# Altium footprint library FootprintLib.PcbLib: 35 footprints (part 3 of 3)
Each footprint in its own frame and in the unit in brackets; x right, y up, seen from the top. Pads: shape width x height; smd on the part's side, far side on the other; paste and mask are expansions set on the pad; w line width, h text height; cw(c..) or ccw(c..) is an arc to the next point about the centre after c.
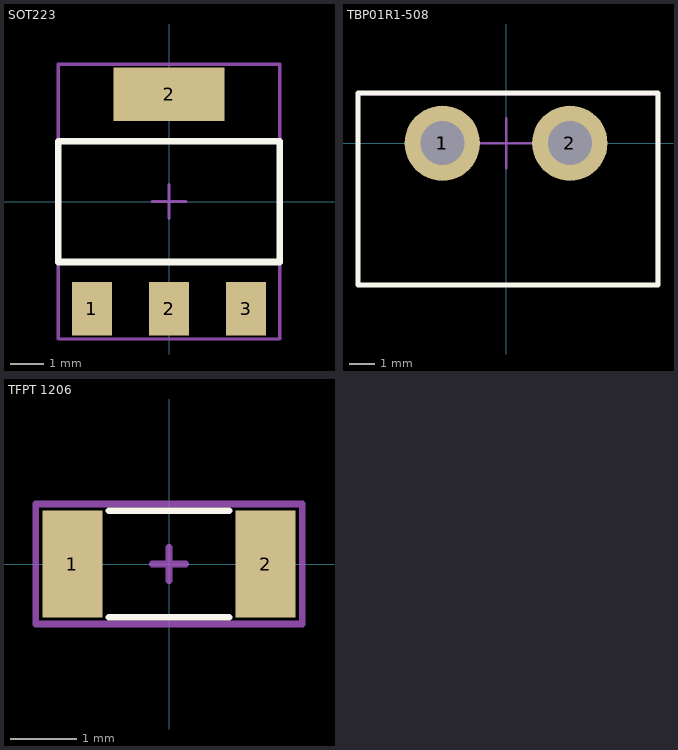
[diagram p2: the footprints below, top view; thin cyan lines are the x and y axes]

## SOT223 [mm]
pads (4):
  rect 1.2x1.6 smd mask+0.05: 1(-2.3,-3.2) 2(0,-3.2) 3(2.3,-3.2)
  rect 3.3x1.6 smd mask+0.05: 2(0,3.2)
Top Overlay:
  lines w0.2: -3.3,-1.8 -3.3,1.8 3.3,1.8 3.3,-1.8 -3.3,-1.8
Top Component Center:
  lines w0.1: -0.5,0 0.5,0 ; 0,-0.5 0,0.5 ; -3.3,-4.1 -3.3,4.1 3.3,4.1 3.3,-4.1 -3.3,-4.1
Top Designator:
  lines w0.1: -3.3,-4.1 -3.3,4.1 3.3,4.1 3.3,-4.1 -3.3,-4.1
  text ".Designator" at -2.1,-0.417 h1
3D body "SOT-223.step": height 1.65, standoff -0.03, extent -3.25,-3.48 3.25,3.48

## TBP01R1-508 [mm]
pads (3):
  round 3 hole 1.75 mask+0.05: 1(-2.54,0) 1(-2.54,0) 2(2.54,0)
Top Overlay:
  lines w0.2: -5.9,-5.65 6.05,-5.65 6.05,2 -5.9,2 -5.9,-5.65
Top Component Center:
  lines w0.1: -1,0 1,0 ; 0,-1 0,1 ; -5.9,-5.65 -5.9,1.95 6,1.95 6,-5.65 -5.9,-5.65
Top Designator:
  lines w0.1: -5.9,-5.65 6,-5.65 6,1.95 -5.9,1.95 -5.9,-5.65
  text ".Designator" at -3.3,-2.184 h2
3D body "TBP01R1-508-02BE.step": height 8.55, standoff -3.95, extent -5.84,-10.1 5.92,1.9

## TFPT 1206 [mm]
pads (2):
  rect 0.9x1.6 smd mask+0.05: 1(-1.45,0) 2(1.45,0)
Top Overlay:
  lines w0.1: -0.9,-0.8 0.9,-0.8 ; -0.9,0.8 0.9,0.8
Top Component Center:
  lines w0.1: -0.25,0 0.25,0 ; 0,-0.25 0,0.25 ; -2,-0.9 2,-0.9 2,0.9 -2,0.9 -2,-0.9
Top Designator:
  lines w0.1: -2,-0.9 2,-0.9 2,0.9 -2,0.9 -2,-0.9
  text ".Designator" at -1,-0.233 h0.5
3D body "RESC1206 v1.step": height 0.55, standoff 0, extent -1.6,-0.8 1.6,0.8